# Altium footprint library TimeCard-NIC-V1.PcbLib: 104 footprints (part 4 of 7)
Each footprint in its own frame and in the unit in brackets; x right, y up, seen from the top. Pads: shape width x height; smd on the part's side, far side on the other; paste and mask are expansions set on the pad; w line width, h text height; cw(c..) or ccw(c..) is an arc to the next point about the centre after c.
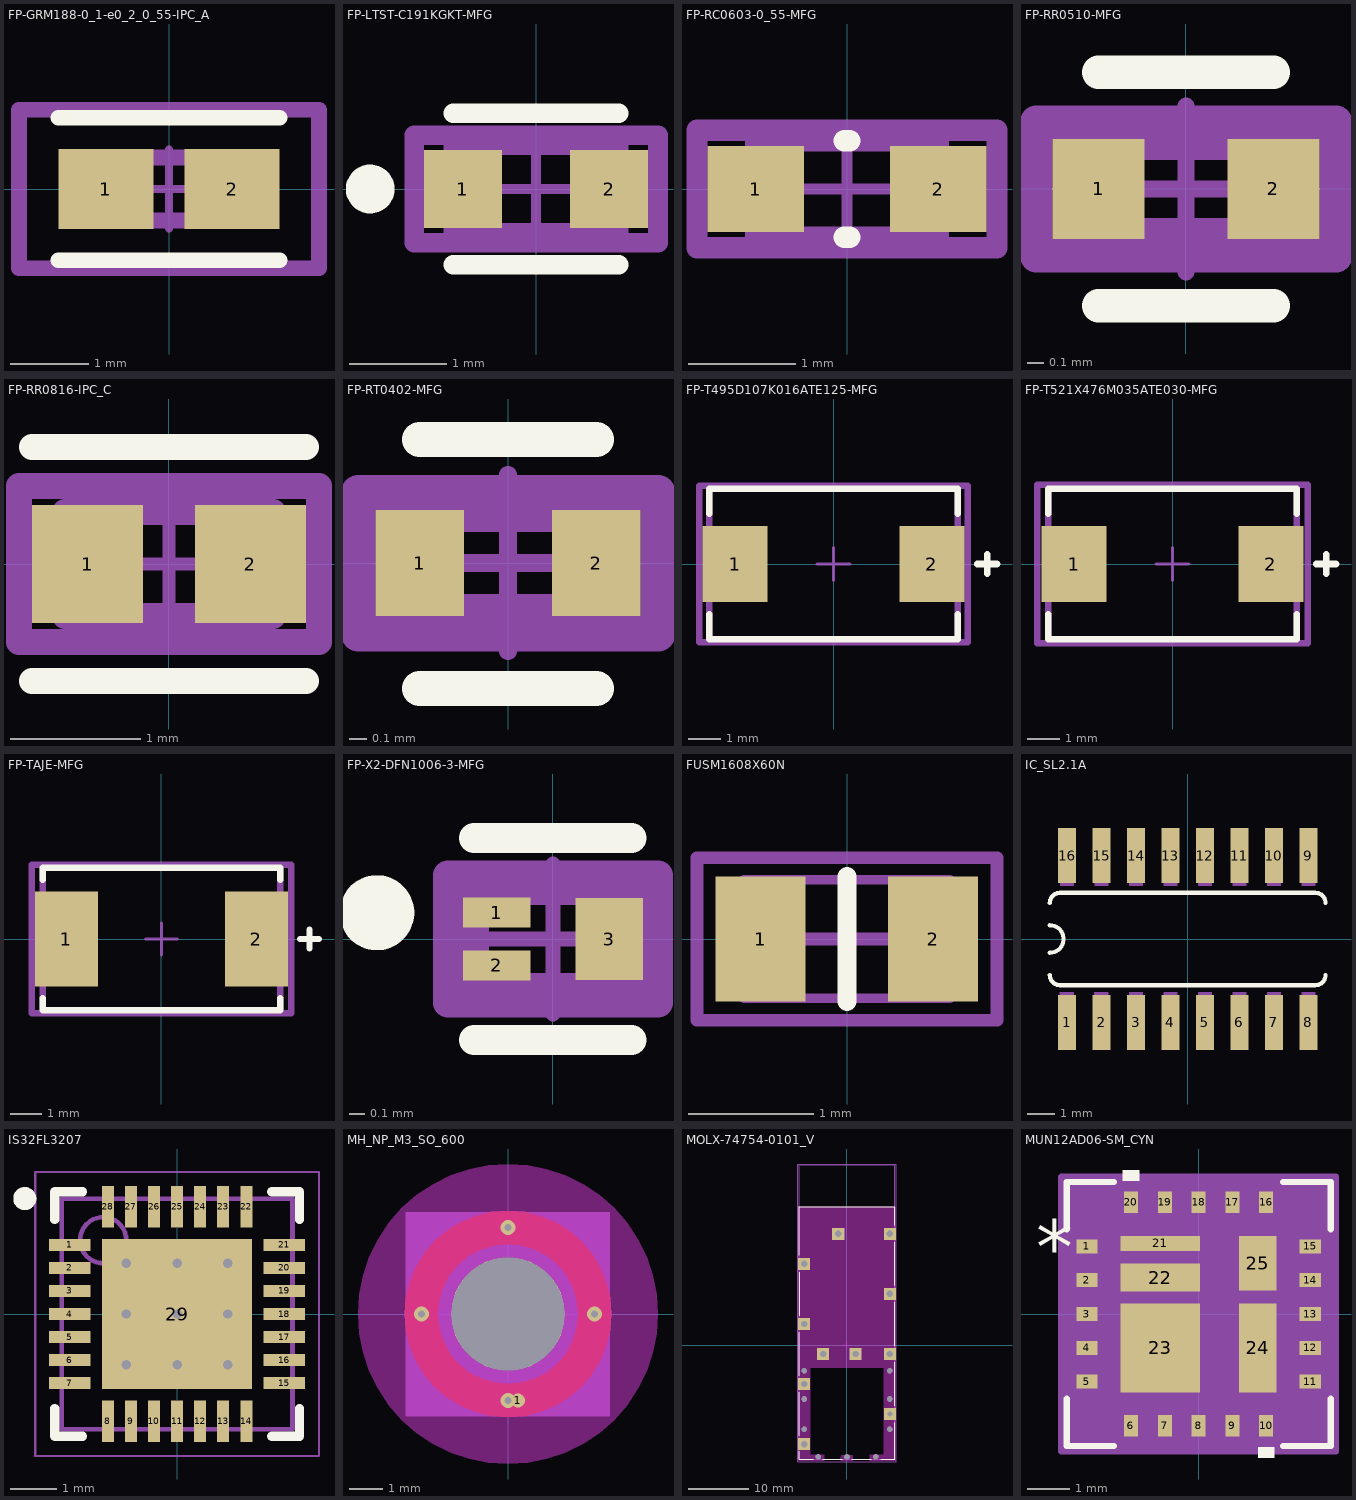
[diagram p3: the footprints below, top view; thin cyan lines are the x and y axes]

## FP-GRM188-0_1-e0_2_0_55-IPC_A [mm]
pads (2):
  rect 1.208x1.012 smd paste+0 mask+0: 1(-0.802,0) 2(0.802,0)
Top Overlay:
  lines w0.2: -1.406,-0.906 1.406,-0.906 ; -1.406,0.906 1.406,0.906
Top 3D Body:
  lines w0.2: -0.8,-0.4 0.8,-0.4 0.8,0.4 -0.8,0.4 -0.8,-0.4
Top Courtyard:
  lines w0.2: -1.906,-1.006 1.906,-1.006 1.906,1.006 -1.906,1.006 -1.906,-1.006
Top Assembly:
  lines w0.2: -1.906,-1.006 1.906,-1.006 1.906,1.006 -1.906,1.006 -1.906,-1.006
  text ".Designator" at 0,0.188 h1
Top Component Center:
  lines w0.1: -0.5,0 0.5,0 ; 0,-0.5 0,0.5
3D body "Cap_Murata_GRM188R60J106KE47D_eec.STEP": height 0.25, standoff 0, extent -1.906,-1.006 1.906,1.006

## FP-LTST-C191KGKT-MFG [mm]
height 2.65
pads (2):
  rect 0.8x0.8 smd paste+0 mask+0: 1(-0.75,0) 2(0.75,0)
Top Overlay:
  circle w0.25: c-1.7,0 r0.125
  lines w0.2: -0.85,-0.775 0.85,-0.775 ; -0.85,0.775 0.85,0.775
Top 3D Body:
  lines w0.2: -0.85,-0.45 0.85,-0.45 0.85,0.45 -0.85,0.45 -0.85,-0.45
Top Courtyard:
  lines w0.2: -1.25,-0.55 1.25,-0.55 1.25,0.55 -1.25,0.55 -1.25,-0.55
Top Assembly:
  lines w0.2: -1.25,-0.55 1.25,-0.55 1.25,0.55 -1.25,0.55 -1.25,-0.55
  text ".Designator" at 0,-0.001 h1
Top Component Center:
  lines w0.1: -0.5,0 0.5,0 ; 0,-0.5 0,0.5
3D body "Diode_Lite-On_LTST-C191KGKT_eec.STEP": height 0.25, standoff 0, extent -1.25,-0.55 1.25,0.55

## FP-RC0603-0_55-MFG [mm]
height 1.7
pads (2):
  rect 0.9x0.8 smd paste+0 mask+0: 1(-0.85,0) 2(0.85,0)
Top Overlay:
  lines w0.2: -0.025,-0.45 0.025,-0.45 ; -0.025,0.45 0.025,0.45
Top 3D Body:
  lines w0.2: -0.85,-0.45 0.85,-0.45 0.85,0.45 -0.85,0.45 -0.85,-0.45
Top Courtyard:
  lines w0.2: -1.4,-0.55 1.4,-0.55 1.4,0.55 -1.4,0.55 -1.4,-0.55
Top Assembly:
  lines w0.2: -1.4,-0.55 1.4,-0.55 1.4,0.55 -1.4,0.55 -1.4,-0.55
Top Component Center:
  lines w0.1: -0.5,0 0.5,0 ; 0,-0.5 0,0.5
3D body "Res_Yageo_RC0603FR-07100KL_eec.STEP": height 0.25, standoff 0, extent -1.4,-0.55 1.4,0.55

## FP-RR0510-MFG [mm]
pads (2):
  rect 0.55x0.6 smd paste+0 mask+0: 1(-0.525,0) 2(0.525,0)
Top Overlay:
  lines w0.2: -0.525,-0.7 0.525,-0.7 ; -0.525,0.7 0.525,0.7
Top 3D Body:
  lines w0.2: -0.525,-0.275 0.525,-0.275 0.525,0.275 -0.525,0.275 -0.525,-0.275
Top Courtyard:
  lines w0.2: -0.9,-0.4 0.9,-0.4 0.9,0.4 -0.9,0.4 -0.9,-0.4
Top Assembly:
  lines w0.2: -0.9,-0.4 0.9,-0.4 0.9,0.4 -0.9,0.4 -0.9,-0.4
  text ".Designator" at 0,0.188 h1
Top Component Center:
  lines w0.1: -0.5,0 0.5,0 ; 0,-0.5 0,0.5
3D body "Res_Susumu_RR0510R-110-D_eec.STEP": height 0.25, standoff 0, extent -0.9,-0.4 0.9,0.4

## FP-RR0816-IPC_C [mm]
height 10.85
pads (2):
  rect 0.855x0.906 smd paste+0 mask+0: 1(-0.626,0) 2(0.626,0)
Top Overlay:
  lines w0.2: -1.053,-0.9 1.053,-0.9 ; -1.053,0.9 1.053,0.9
Top 3D Body:
  lines w0.2: -0.8,-0.4 0.8,-0.4 0.8,0.4 -0.8,0.4 -0.8,-0.4
Top Courtyard:
  lines w0.2: -1.153,-0.6 1.153,-0.6 1.153,0.6 -1.153,0.6 -1.153,-0.6
Top Assembly:
  lines w0.2: -1.153,-0.6 1.153,-0.6 1.153,0.6 -1.153,0.6 -1.153,-0.6
  text ".Designator" at 0,0.188 h1
Top Component Center:
  lines w0.1: -0.5,0 0.5,0 ; 0,-0.5 0,0.5
3D body "Res_Susumu_RR0816P-364-D_eec.STEP": height 0.25, standoff 0, extent -1.153,-0.6 1.153,0.6

## FP-RT0402-MFG [mm]
height 10.85
pads (2):
  rect 0.5x0.6 smd paste+0 mask+0: 1(-0.5,0) 2(0.5,0)
Top Overlay:
  lines w0.2: -0.5,-0.711 0.5,-0.711 ; -0.5,0.7 0.5,0.7
Top 3D Body:
  lines w0.2: -0.55,-0.275 0.55,-0.275 0.55,0.275 -0.55,0.275 -0.55,-0.275
Top Courtyard:
  lines w0.2: -0.85,-0.4 0.85,-0.4 0.85,0.4 -0.85,0.4 -0.85,-0.4
Top Assembly:
  lines w0.2: -0.85,-0.4 0.85,-0.4 0.85,0.4 -0.85,0.4 -0.85,-0.4
  text ".Designator" at 0,0.188 h1
Top Component Center:
  lines w0.1: -0.5,0 0.5,0 ; 0,-0.5 0,0.5
3D body "Res_Yageo_RT0402BRE07118KL_eec.STEP": height 0.25, standoff 0, extent -0.85,-0.4 0.85,0.4

## FP-T495D107K016ATE125-MFG [mm]
height 10.85
pads (2):
  rect 1.99x2.33 smd paste+0 mask+0: 1(-3.01,0) 2(3.01,0)
Top Overlay:
  lines w0.2: -3.8,-1.54 -3.8,-2.3 3.8,-2.3 3.8,-1.54 ; -3.8,1.54 -3.8,2.3 3.8,2.3 3.8,1.54 ; 4.4,0 5,0 ; 4.7,-0.3 4.7,0.3
Top 3D Body:
  lines w0.2: -3.8,-2.3 3.8,-2.3 3.8,2.3 -3.8,2.3 -3.8,-2.3
Top Courtyard:
  lines w0.2: -4.105,-2.4 4.105,-2.4 4.105,2.4 -4.105,2.4 -4.105,-2.4
Top Assembly:
  lines w0.2: -4.105,-2.4 4.105,-2.4 4.105,2.4 -4.105,2.4 -4.105,-2.4
  text ".Designator" at 0,-0.001 h1
Top Component Center:
  lines w0.1: -0.5,0 0.5,0 ; 0,-0.5 0,0.5
3D body "Cap_Kemet_T495D107K016ATE125_eec.STEP": height 0.25, standoff 0, extent -4.105,-2.4 4.105,2.4

## FP-T521X476M035ATE030-MFG [mm]
height 10.85
pads (2):
  rect 1.99x2.33 smd paste+0 mask+0: 1(-3.01,0) 2(3.01,0)
Top Overlay:
  lines w0.2: -3.8,-1.54 -3.8,-2.3 3.8,-2.3 3.8,-1.54 ; -3.8,1.54 -3.8,2.3 3.8,2.3 3.8,1.54 ; 4.4,0 5,0 ; 4.7,-0.3 4.7,0.3
Top 3D Body:
  lines w0.2: -3.8,-2.3 3.8,-2.3 3.8,2.3 -3.8,2.3 -3.8,-2.3
Top Courtyard:
  lines w0.2: -4.13,-2.42 4.13,-2.42 4.13,2.42 -4.13,2.42 -4.13,-2.42
Top Assembly:
  lines w0.2: -4.13,-2.42 4.13,-2.42 4.13,2.42 -4.13,2.42 -4.13,-2.42
  text ".Designator" at 0,-0.001 h1
Top Component Center:
  lines w0.1: -0.5,0 0.5,0 ; 0,-0.5 0,0.5
3D body "Cap_Kemet_T521X476M035ATE030_eec.STEP": height 0.25, standoff 0, extent -4.13,-2.42 4.13,2.42

## FP-TAJE-MFG [mm]
height 10.85
pads (2):
  rect 2x3 smd paste+0 mask+0: 1(-3,0) 2(3,0)
Top Overlay:
  lines w0.2: -3.75,-1.875 -3.75,-2.25 3.75,-2.25 3.75,-1.875 ; -3.75,1.875 -3.75,2.25 3.75,2.25 3.75,1.875 ; 4.375,0 4.975,0 ; 4.675,-0.3 4.675,0.3
Top 3D Body:
  lines w0.2: -3.75,-2.25 3.75,-2.25 3.75,2.25 -3.75,2.25 -3.75,-2.25
Top Courtyard:
  lines w0.2: -4.1,-2.35 4.1,-2.35 4.1,2.35 -4.1,2.35 -4.1,-2.35
Top Assembly:
  lines w0.2: -4.1,-2.35 4.1,-2.35 4.1,2.35 -4.1,2.35 -4.1,-2.35
  text ".Designator" at 0,-0.001 h1
Top Component Center:
  lines w0.1: -0.5,0 0.5,0 ; 0,-0.5 0,0.5
3D body "Cap_AVX_TAJE108K002RNJ_eec.STEP": height 0.25, standoff 0, extent -4.1,-2.35 4.1,2.35

## FP-X2-DFN1006-3-MFG [mm]
height 10.85
pads (3):
  rect 0.45x0.2 smd paste+0 mask+0: 1(-0.375,0.175) 2(-0.375,-0.175)
  rect 0.45x0.55 smd paste+0 mask+0: 3(0.375,0)
Top Overlay:
  circle w0.25: c-1.175,0.175 r0.125
  lines w0.2: -0.525,-0.675 0.525,-0.675 ; -0.525,0.675 0.525,0.675
Top 3D Body:
  lines w0.2: -0.525,-0.325 0.525,-0.325 0.525,0.325 -0.525,0.325 -0.525,-0.325
Top Courtyard:
  lines w0.2: -0.7,-0.425 0.7,-0.425 0.7,0.425 -0.7,0.425 -0.7,-0.425
Top Assembly:
  lines w0.2: -0.7,-0.425 0.7,-0.425 0.7,0.425 -0.7,0.425 -0.7,-0.425
  text ".Designator" at 0,-0.001 h1
Top Component Center:
  lines w0.1: -0.5,0 0.5,0 ; 0,-0.5 0,0.5
3D body "Trans_Diodes_Inc_DMN26D0UFB4-7_eec.STEP": height 0.25, standoff 0, extent -0.7,-0.425 0.7,0.425

## FUSM1608X60N [mm] "Chip Fuse, 0603, 2-Leads, Body 1.60x0.81mm, IPC Medium Density"
height 0.5
pads (2):
  rect 0.72x1 smd: 1(-0.69,0) 2(0.69,0)
Top Overlay:
  lines w0.152: 0,-0.5 0,0.5
Mechanical 13:
  lines w0.076: -0.825,-0.475 0.825,-0.475 0.825,0.475 -0.825,0.475 -0.825,-0.475
  text ".Designator" at -0.41,-0.327 h1.02
Mechanical 15:
  lines w0.102: -0.475,0 0.475,0 ; 0,-0.475 0,0.475 ; -1.2,-0.65 1.2,-0.65 1.2,0.65 -1.2,0.65 -1.2,-0.65
3D body: height 0.13, standoff 0, extent 0.457,-0.305 0.686,0.305
3D body: height 0.13, standoff 0, extent -0.686,-0.305 -0.457,0.305
3D body: height 0.61, standoff 0.25, extent -0.813,-0.406 0.813,0.406
3D body: height 0.25, standoff 0.05, extent -0.813,-0.406 0.813,0.406

## IC_SL2.1A [mil]
pads (16):
  rect 26x80 smd: 1(-175,-121) 2(-125,-121) 3(-75,-121) 4(-25,-121) 5(25,-121) 6(75,-121) 7(125,-121) 8(175,-121) 9(175,121) 10(125,121) 11(75,121) 12(25,121) 13(-25,121) 14(-75,121) 15(-125,121) 16(-175,121)
Top Overlay:
  lines w6: -200,-52 ccw(c-185,-52) -185,-67 185,-67 ccw(c185,-52) 200,-52 ; -200,-20 ccw(c-200,0) -200,20 ; -200,52 cw(c-185,52) -185,67 185,67 cw(c185,52) 200,52
Mechanical 13:
  region: -15,77 -35,77 -35,122 -15,122
  region: -165,-122.18 -185.27,-122.18 -185.27,-77 -165,-77
  region: -115,-122.16 -135.18,-122.16 -135.18,-77 -115,-77
  region: -65,-122.55 -85.07,-122.55 -85.07,-77.45 -65,-77.45
  region: -15,-122.14 -35.04,-122.14 -35.04,-77 -15,-77
  region: -65,77.09 -85.1,77.09 -85.1,122 -65,122
  region: -115,77.03 -135.05,77.03 -135.05,122 -115,122
  region: -165,77.01 -185.02,77.01 -185.02,122 -165,122
  region: 35,-122.06 15.01,-122.06 15.01,-77 35,-77
  region: 85,-122.16 65.08,-122.16 65.08,-77 85,-77
  region: 135,-122.14 115.13,-122.14 115.13,-77 135,-77
  region: 185,-122.08 165.11,-122.08 165.11,-77 185,-77
  region: 35,77.14 15.03,77.14 15.03,122 35,122
  region: 85,77.12 65.1,77.12 65.1,122 85,122
  region: 135,77.02 115.02,77.02 115.02,122 135,122
  region: 185,77.02 165.05,77.02 165.05,122 185,122
3D body "CircuitWorks-SO-16.step": height 57, standoff 0, extent -196.5,-115 196.5,117.49

## IS32FL3207 [mm]
height 0.8
pads (29):
  rect 0.9x0.26 smd: 1(-2.325,1.5) 2(-2.325,1) 3(-2.325,0.5) 4(-2.325,0) 5(-2.325,-0.5) 6(-2.325,-1) 7(-2.325,-1.5) 15(2.325,-1.5) 16(2.325,-1) 17(2.325,-0.5) 18(2.325,0) 19(2.325,0.5) 20(2.325,1) 21(2.325,1.5)
  rect 0.26x0.9 smd: 8(-1.5,-2.325) 9(-1,-2.325) 10(-0.5,-2.325) 11(0,-2.325) 12(0.5,-2.325) 13(1,-2.325) 14(1.5,-2.325) 22(1.5,2.325) 23(1,2.325) 24(0.5,2.325) 25(0,2.325) 26(-0.5,2.325) 27(-1,2.325) 28(-1.5,2.325)
  rect 3.25x3.25 smd: 29(0,0)
via 1.1,-1.1 diameter 0.406 hole 0.203
via 0,-1.1 diameter 0.406 hole 0.203
via -1.1,-1.1 diameter 0.406 hole 0.203
via 1.1,0 diameter 0.406 hole 0.203
via 0,0 diameter 0.406 hole 0.203
via -1.1,0 diameter 0.406 hole 0.203
via 1.1,1.1 diameter 0.406 hole 0.203
via 0,1.1 diameter 0.406 hole 0.203
via -1.1,1.1 diameter 0.406 hole 0.203
Top Overlay:
  circle w0.25: c-3.3,2.5 r0.125
  lines w0.2: -2.65,-2.05 -2.65,-2.65 -2.05,-2.65 ; -2.65,2.05 -2.65,2.65 -2.05,2.65 ; 2.05,-2.65 2.65,-2.65 2.65,-2.05 ; 2.05,2.65 2.65,2.65 2.65,2.05
Mechanical 13:
  circle w0.1: c-1.6,1.6 r0.5
  lines w0.1: -2.5,-2.5 2.5,-2.5 2.5,2.5 -2.5,2.5 -2.5,-2.5
Mechanical 15:
  lines w0.05: -3.075,-3.075 3.075,-3.075 3.075,3.075 -3.075,3.075 -3.075,-3.075
  lines w0.1: -0.5,0 0.5,0 ; 0,-0.5 0,0.5
3D body "jj.step": height 0.8, standoff 0, extent -2.501,-2.501 2.501,2.501

## MH_NP_M3_SO_600 [mm] "MH_NP_M3_SO_600"
pads (2):
  round 0.43 smd: 1(0.3,-2.6)
  round 3.4 hole 3.404 unplated: ""(0,0)
via 0,-2.6 diameter 0.457 hole 0.203
via 0,2.6 diameter 0.457 hole 0.203
via 2.6,0 diameter 0.457 hole 0.203
via -2.6,0 diameter 0.457 hole 0.203
Top Layer:
  region: 3.111,0 3.073,0.487 2.959,0.961 2.772,1.412 2.517,1.829 2.2,2.2 1.829,2.517 1.412,2.772 0.961,2.959 0.487,3.073 0,3.111 -0.487,3.073 -0.961,2.959 -1.412,2.772 -1.551,2.687 -1.829,2.517 -2.2,2.2 -2.517,1.829 -2.772,1.412 -2.959,0.961 -3.073,0.487 -3.111,0 -3.073,-0.487 -2.959,-0.961 -2.772,-1.412 -2.517,-1.829 -2.2,-2.2 -1.829,-2.517 -1.551,-2.687 -1.412,-2.772 -0.961,-2.959 -0.487,-3.073 0,-3.111 0.487,-3.073 0.961,-2.959 1.412,-2.772 1.829,-2.517 2.2,-2.2 2.517,-1.829 2.772,-1.412 2.959,-0.961 3.073,-0.487 hole: 2.098,0 2.058,0.409 1.938,0.803 1.745,1.166 1.484,1.484 1.166,1.745 0.803,1.938 0.409,2.058 0,2.098 -0.409,2.058 -0.803,1.938 -1.045,1.809 -1.045,1.809 -1.166,1.745 -1.484,1.484 -1.745,1.166 -1.938,0.803 -2.058,0.409 -2.098,0 -2.058,-0.409 -1.938,-0.803 -1.745,-1.166 -1.484,-1.484 -1.166,-1.745 -1.045,-1.809 -1.045,-1.809 -0.803,-1.938 -0.409,-2.058 0,-2.098 0.409,-2.058 0.803,-1.938 1.166,-1.745 1.484,-1.484 1.745,-1.166 1.938,-0.803 2.058,-0.409 2.098,0
Top Layer keep-out:
  region: 4.51,0 4.471,0.589 4.356,1.167 4.166,1.726 3.905,2.255 3.578,2.745 3.189,3.189 2.745,3.578 2.255,3.905 1.726,4.166 1.167,4.356 0.589,4.471 0,4.51 -0.589,4.471 -1.167,4.356 -1.726,4.166 -2.255,3.905 -2.745,3.578 -3.189,3.189 -3.578,2.745 -3.905,2.255 -4.166,1.726 -4.356,1.167 -4.471,0.589 -4.51,0 -4.471,-0.589 -4.356,-1.167 -4.166,-1.726 -3.905,-2.255 -3.578,-2.745 -3.189,-3.189 -2.745,-3.578 -2.255,-3.905 -1.726,-4.166 -1.167,-4.356 -0.589,-4.471 0,-4.51 0.589,-4.471 1.167,-4.356 1.726,-4.166 2.255,-3.905 2.745,-3.578 3.189,-3.189 3.578,-2.745 3.905,-2.255 4.166,-1.726 4.356,-1.167 4.471,-0.589
  region: 4.51,0 4.471,0.589 4.356,1.167 4.166,1.726 3.905,2.255 3.578,2.745 3.189,3.189 2.745,3.578 2.255,3.905 1.726,4.166 1.167,4.356 0.589,4.471 0,4.51 -0.589,4.471 -1.167,4.356 -1.726,4.166 -2.255,3.905 -2.745,3.578 -3.189,3.189 -3.578,2.745 -3.905,2.255 -4.166,1.726 -4.356,1.167 -4.471,0.589 -4.51,0 -4.471,-0.589 -4.356,-1.167 -4.166,-1.726 -3.905,-2.255 -3.578,-2.745 -3.189,-3.189 -2.745,-3.578 -2.255,-3.905 -1.726,-4.166 -1.167,-4.356 -0.589,-4.471 0,-4.51 0.589,-4.471 1.167,-4.356 1.726,-4.166 2.255,-3.905 2.745,-3.578 3.189,-3.189 3.578,-2.745 3.905,-2.255 4.166,-1.726 4.356,-1.167 4.471,-0.589
Mid-Layer 1 keep-out:
  region: 2.365,0 2.32,0.461 2.185,0.905 1.967,1.314 1.672,1.672 1.314,1.967 0.905,2.185 0.461,2.32 0,2.365 -0.461,2.32 -0.905,2.185 -1.177,2.039 -1.314,1.967 -1.672,1.672 -1.967,1.314 -2.185,0.905 -2.32,0.461 -2.365,0 -2.32,-0.461 -2.185,-0.905 -1.967,-1.314 -1.672,-1.672 -1.314,-1.967 -1.177,-2.039 -0.905,-2.185 -0.461,-2.32 0,-2.365 0.461,-2.32 0.905,-2.185 1.314,-1.967 1.672,-1.672 1.967,-1.314 2.185,-0.905 2.32,-0.461
Mid-Layer 2 keep-out:
  region: 4.51,0 4.471,0.589 4.356,1.167 4.166,1.726 3.905,2.255 3.578,2.745 3.189,3.189 2.745,3.578 2.255,3.905 1.726,4.166 1.167,4.356 0.589,4.471 0,4.51 -0.589,4.471 -1.167,4.356 -1.726,4.166 -2.255,3.905 -2.745,3.578 -3.189,3.189 -3.578,2.745 -3.905,2.255 -4.166,1.726 -4.356,1.167 -4.471,0.589 -4.51,0 -4.471,-0.589 -4.356,-1.167 -4.166,-1.726 -3.905,-2.255 -3.578,-2.745 -3.189,-3.189 -2.745,-3.578 -2.255,-3.905 -1.726,-4.166 -1.167,-4.356 -0.589,-4.471 0,-4.51 0.589,-4.471 1.167,-4.356 1.726,-4.166 2.255,-3.905 2.745,-3.578 3.189,-3.189 3.578,-2.745 3.905,-2.255 4.166,-1.726 4.356,-1.167 4.471,-0.589
Mid-Layer 3 keep-out:
  region: 2.365,0 2.32,0.461 2.185,0.905 1.967,1.314 1.672,1.672 1.314,1.967 0.905,2.185 0.461,2.32 0,2.365 -0.461,2.32 -0.905,2.185 -1.177,2.039 -1.314,1.967 -1.672,1.672 -1.967,1.314 -2.185,0.905 -2.32,0.461 -2.365,0 -2.32,-0.461 -2.185,-0.905 -1.967,-1.314 -1.672,-1.672 -1.314,-1.967 -1.177,-2.039 -0.905,-2.185 -0.461,-2.32 0,-2.365 0.461,-2.32 0.905,-2.185 1.314,-1.967 1.672,-1.672 1.967,-1.314 2.185,-0.905 2.32,-0.461
Mid-Layer 4 keep-out:
  region: 4.51,0 4.471,0.589 4.356,1.167 4.166,1.726 3.905,2.255 3.578,2.745 3.189,3.189 2.745,3.578 2.255,3.905 1.726,4.166 1.167,4.356 0.589,4.471 0,4.51 -0.589,4.471 -1.167,4.356 -1.726,4.166 -2.255,3.905 -2.745,3.578 -3.189,3.189 -3.578,2.745 -3.905,2.255 -4.166,1.726 -4.356,1.167 -4.471,0.589 -4.51,0 -4.471,-0.589 -4.356,-1.167 -4.166,-1.726 -3.905,-2.255 -3.578,-2.745 -3.189,-3.189 -2.745,-3.578 -2.255,-3.905 -1.726,-4.166 -1.167,-4.356 -0.589,-4.471 0,-4.51 0.589,-4.471 1.167,-4.356 1.726,-4.166 2.255,-3.905 2.745,-3.578 3.189,-3.189 3.578,-2.745 3.905,-2.255 4.166,-1.726 4.356,-1.167 4.471,-0.589
Mid-Layer 5 keep-out:
  region: 2.365,0 2.32,0.461 2.185,0.905 1.967,1.314 1.672,1.672 1.314,1.967 0.905,2.185 0.461,2.32 0,2.365 -0.461,2.32 -0.905,2.185 -1.177,2.039 -1.314,1.967 -1.672,1.672 -1.967,1.314 -2.185,0.905 -2.32,0.461 -2.365,0 -2.32,-0.461 -2.185,-0.905 -1.967,-1.314 -1.672,-1.672 -1.314,-1.967 -1.177,-2.039 -0.905,-2.185 -0.461,-2.32 0,-2.365 0.461,-2.32 0.905,-2.185 1.314,-1.967 1.672,-1.672 1.967,-1.314 2.185,-0.905 2.32,-0.461
Mid-Layer 6 keep-out:
  region: 2.365,0 2.32,0.461 2.185,0.905 1.967,1.314 1.672,1.672 1.314,1.967 0.905,2.185 0.461,2.32 0,2.365 -0.461,2.32 -0.905,2.185 -1.177,2.039 -1.314,1.967 -1.672,1.672 -1.967,1.314 -2.185,0.905 -2.32,0.461 -2.365,0 -2.32,-0.461 -2.185,-0.905 -1.967,-1.314 -1.672,-1.672 -1.314,-1.967 -1.177,-2.039 -0.905,-2.185 -0.461,-2.32 0,-2.365 0.461,-2.32 0.905,-2.185 1.314,-1.967 1.672,-1.672 1.967,-1.314 2.185,-0.905 2.32,-0.461
Mid-Layer 7 keep-out:
  region: 2.365,0 2.32,0.461 2.185,0.905 1.967,1.314 1.672,1.672 1.314,1.967 0.905,2.185 0.461,2.32 0,2.365 -0.461,2.32 -0.905,2.185 -1.177,2.039 -1.314,1.967 -1.672,1.672 -1.967,1.314 -2.185,0.905 -2.32,0.461 -2.365,0 -2.32,-0.461 -2.185,-0.905 -1.967,-1.314 -1.672,-1.672 -1.314,-1.967 -1.177,-2.039 -0.905,-2.185 -0.461,-2.32 0,-2.365 0.461,-2.32 0.905,-2.185 1.314,-1.967 1.672,-1.672 1.967,-1.314 2.185,-0.905 2.32,-0.461
Mid-Layer 8 keep-out:
  region: 2.365,0 2.32,0.461 2.185,0.905 1.967,1.314 1.672,1.672 1.314,1.967 0.905,2.185 0.461,2.32 0,2.365 -0.461,2.32 -0.905,2.185 -1.177,2.039 -1.314,1.967 -1.672,1.672 -1.967,1.314 -2.185,0.905 -2.32,0.461 -2.365,0 -2.32,-0.461 -2.185,-0.905 -1.967,-1.314 -1.672,-1.672 -1.314,-1.967 -1.177,-2.039 -0.905,-2.185 -0.461,-2.32 0,-2.365 0.461,-2.32 0.905,-2.185 1.314,-1.967 1.672,-1.672 1.967,-1.314 2.185,-0.905 2.32,-0.461
Mid-Layer 9 keep-out:
  region: 4.51,0 4.471,0.589 4.356,1.167 4.166,1.726 3.905,2.255 3.578,2.745 3.189,3.189 2.745,3.578 2.255,3.905 1.726,4.166 1.167,4.356 0.589,4.471 0,4.51 -0.589,4.471 -1.167,4.356 -1.726,4.166 -2.255,3.905 -2.745,3.578 -3.189,3.189 -3.578,2.745 -3.905,2.255 -4.166,1.726 -4.356,1.167 -4.471,0.589 -4.51,0 -4.471,-0.589 -4.356,-1.167 -4.166,-1.726 -3.905,-2.255 -3.578,-2.745 -3.189,-3.189 -2.745,-3.578 -2.255,-3.905 -1.726,-4.166 -1.167,-4.356 -0.589,-4.471 0,-4.51 0.589,-4.471 1.167,-4.356 1.726,-4.166 2.255,-3.905 2.745,-3.578 3.189,-3.189 3.578,-2.745 3.905,-2.255 4.166,-1.726 4.356,-1.167 4.471,-0.589
Mid-Layer 10 keep-out:
  region: 2.365,0 2.32,0.461 2.185,0.905 1.967,1.314 1.672,1.672 1.314,1.967 0.905,2.185 0.461,2.32 0,2.365 -0.461,2.32 -0.905,2.185 -1.177,2.039 -1.314,1.967 -1.672,1.672 -1.967,1.314 -2.185,0.905 -2.32,0.461 -2.365,0 -2.32,-0.461 -2.185,-0.905 -1.967,-1.314 -1.672,-1.672 -1.314,-1.967 -1.177,-2.039 -0.905,-2.185 -0.461,-2.32 0,-2.365 0.461,-2.32 0.905,-2.185 1.314,-1.967 1.672,-1.672 1.967,-1.314 2.185,-0.905 2.32,-0.461
Mid-Layer 11 keep-out:
  region: 4.51,0 4.471,0.589 4.356,1.167 4.166,1.726 3.905,2.255 3.578,2.745 3.189,3.189 2.745,3.578 2.255,3.905 1.726,4.166 1.167,4.356 0.589,4.471 0,4.51 -0.589,4.471 -1.167,4.356 -1.726,4.166 -2.255,3.905 -2.745,3.578 -3.189,3.189 -3.578,2.745 -3.905,2.255 -4.166,1.726 -4.356,1.167 -4.471,0.589 -4.51,0 -4.471,-0.589 -4.356,-1.167 -4.166,-1.726 -3.905,-2.255 -3.578,-2.745 -3.189,-3.189 -2.745,-3.578 -2.255,-3.905 -1.726,-4.166 -1.167,-4.356 -0.589,-4.471 0,-4.51 0.589,-4.471 1.167,-4.356 1.726,-4.166 2.255,-3.905 2.745,-3.578 3.189,-3.189 3.578,-2.745 3.905,-2.255 4.166,-1.726 4.356,-1.167 4.471,-0.589
Mid-Layer 12 keep-out:
  region: 2.365,0 2.32,0.461 2.185,0.905 1.967,1.314 1.672,1.672 1.314,1.967 0.905,2.185 0.461,2.32 0,2.365 -0.461,2.32 -0.905,2.185 -1.177,2.039 -1.314,1.967 -1.672,1.672 -1.967,1.314 -2.185,0.905 -2.32,0.461 -2.365,0 -2.32,-0.461 -2.185,-0.905 -1.967,-1.314 -1.672,-1.672 -1.314,-1.967 -1.177,-2.039 -0.905,-2.185 -0.461,-2.32 0,-2.365 0.461,-2.32 0.905,-2.185 1.314,-1.967 1.672,-1.672 1.967,-1.314 2.185,-0.905 2.32,-0.461
Bottom Layer:
  region: 3.11,0 3.071,0.486 2.957,0.961 2.771,1.412 2.516,1.828 2.199,2.199 1.828,2.516 1.412,2.771 0.961,2.957 0.486,3.071 0,3.11 -0.486,3.071 -0.961,2.957 -1.412,2.771 -1.551,2.686 -1.828,2.516 -2.199,2.199 -2.516,1.828 -2.771,1.412 -2.957,0.961 -3.071,0.486 -3.11,0 -3.071,-0.486 -2.957,-0.961 -2.771,-1.412 -2.516,-1.828 -2.199,-2.199 -1.828,-2.516 -1.551,-2.686 -1.412,-2.771 -0.961,-2.957 -0.486,-3.071 0,-3.11 0.486,-3.071 0.961,-2.957 1.412,-2.771 1.828,-2.516 2.199,-2.199 2.516,-1.828 2.771,-1.412 2.957,-0.961 3.071,-0.486 hole: 2.11,0 2.07,0.412 1.95,0.808 1.755,1.172 1.492,1.492 1.172,1.755 0.808,1.95 0.412,2.07 0,2.11 -0.412,2.07 -0.808,1.95 -1.051,1.82 -1.051,1.82 -1.172,1.755 -1.492,1.492 -1.755,1.172 -1.95,0.808 -2.07,0.412 -2.11,0 -2.07,-0.412 -1.95,-0.808 -1.755,-1.172 -1.492,-1.492 -1.172,-1.755 -1.051,-1.82 -1.051,-1.82 -0.808,-1.95 -0.412,-2.07 0,-2.11 0.412,-2.07 0.808,-1.95 1.172,-1.755 1.492,-1.492 1.755,-1.172 1.95,-0.808 2.07,-0.412 2.11,0
Top Solder:
  dashed: 3.11,0 3.071,0.486 2.957,0.961 2.771,1.412 2.516,1.828 2.199,2.199 1.828,2.516 1.412,2.771 0.961,2.957 0.486,3.071 0,3.11 -0.486,3.071 -0.961,2.957 -1.412,2.771 -1.551,2.686 -1.828,2.516 -2.199,2.199 -2.516,1.828 -2.771,1.412 -2.957,0.961 -3.071,0.486 -3.11,0 -3.071,-0.486 -2.957,-0.961 -2.771,-1.412 -2.516,-1.828 -2.199,-2.199 -1.828,-2.516 -1.551,-2.686 -1.412,-2.771 -0.961,-2.957 -0.486,-3.071 0,-3.11 0.486,-3.071 0.961,-2.957 1.412,-2.771 1.828,-2.516 2.199,-2.199 2.516,-1.828 2.771,-1.412 2.957,-0.961 3.071,-0.486 hole: 2.11,0 2.07,0.412 1.95,0.808 1.755,1.172 1.492,1.492 1.172,1.755 0.808,1.95 0.412,2.07 0,2.11 -0.412,2.07 -0.808,1.95 -1.051,1.82 -1.051,1.82 -1.172,1.755 -1.492,1.492 -1.755,1.172 -1.95,0.808 -2.07,0.412 -2.11,0 -2.07,-0.412 -1.95,-0.808 -1.755,-1.172 -1.492,-1.492 -1.172,-1.755 -1.051,-1.82 -1.051,-1.82 -0.808,-1.95 -0.412,-2.07 0,-2.11 0.412,-2.07 0.808,-1.95 1.172,-1.755 1.492,-1.492 1.755,-1.172 1.95,-0.808 2.07,-0.412 2.11,0
Bottom Solder:
  dashed: 3.11,0 3.071,0.486 2.957,0.961 2.771,1.412 2.516,1.828 2.199,2.199 1.828,2.516 1.412,2.771 0.961,2.957 0.486,3.071 0,3.11 -0.486,3.071 -0.961,2.957 -1.412,2.771 -1.551,2.686 -1.828,2.516 -2.199,2.199 -2.516,1.828 -2.771,1.412 -2.957,0.961 -3.071,0.486 -3.11,0 -3.071,-0.486 -2.957,-0.961 -2.771,-1.412 -2.516,-1.828 -2.199,-2.199 -1.828,-2.516 -1.551,-2.686 -1.412,-2.771 -0.961,-2.957 -0.486,-3.071 0,-3.11 0.486,-3.071 0.961,-2.957 1.412,-2.771 1.828,-2.516 2.199,-2.199 2.516,-1.828 2.771,-1.412 2.957,-0.961 3.071,-0.486 hole: 2.11,0 2.07,0.412 1.95,0.808 1.755,1.172 1.492,1.492 1.172,1.755 0.808,1.95 0.412,2.07 0,2.11 -0.412,2.07 -0.808,1.95 -1.051,1.82 -1.051,1.82 -1.172,1.755 -1.492,1.492 -1.755,1.172 -1.95,0.808 -2.07,0.412 -2.11,0 -2.07,-0.412 -1.95,-0.808 -1.755,-1.172 -1.492,-1.492 -1.172,-1.755 -1.051,-1.82 -1.051,-1.82 -0.808,-1.95 -0.412,-2.07 0,-2.11 0.412,-2.07 0.808,-1.95 1.172,-1.755 1.492,-1.492 1.755,-1.172 1.95,-0.808 2.07,-0.412 2.11,0
Top 3D Body:
  region: -3.065,-3.065 3.065,-3.065 3.065,3.065 -3.065,3.065
Top Courtyard:
  lines w0.025: -3.065,-3.065 3.065,-3.065 3.065,3.065 -3.065,3.065 -3.065,-3.065
Top Assembly:
  lines w0.025: -3.065,-3.065 3.065,-3.065 3.065,3.065 -3.065,3.065 -3.065,-3.065
Bottom Component Center:
  text "1" at -0.608,-2.8 h0.64
Top Component Outline:
  text "MOUNTING HOLE FOR SCREW: 92000A116" at -5.08,20.32 h1.27
  text "WITH STAND OFF: 94868A007, BOTTOM SIDE" at -5.08,16.18 h1.27
  text "CREATED: C. HENLEY 7-30-20" at -5.08,12.7 h1.27
  text "CHECKED:" at -5.08,10.16 h1.27
3D body: height 3.81, standoff 0, extent -3.065,-3.065 3.065,3.065

## MOLX-74754-0101_V [mm] "SFP+ Cage, 1-Port, Body 49x15.9mm"
height 10.85
pads (20):
  rect 2x2 hole 1.05: MH1(-7.125,13.55) MH2(-7.125,3.55) MH3(-7.125,-6.45) MH4(-7.125,-16.45) MH6(7.125,-1.45) MH7(7.125,8.55) MH8(7.125,18.55) MH9(-1.455,18.55) MH10(-3.955,-1.45) MH11(1.445,-1.45)
  rect 2x2 hole 0.85: MH5(7.125,-11.45)
  round 0 hole 0.95: MH12(-7.13,-4.25) MH13(-7.13,-8.95) MH14(-7.13,-13.95) MH15(-4.8,-18.55) MH16(0,-18.55) MH17(4.8,-18.55) MH18(7.13,-13.95) MH19(7.13,-8.95) MH20(7.13,-4.25)
Top Layer keep-out:
  region: 1,-19.25 1,-18.25 -1,-18.25 -1,-19.25
  region: -8.125,23.05 -8.125,-19.25 -3.795,-19.25 -3.795,-18.25 -6.125,-18.25 -6.125,-3.75 6.125,-3.75 6.125,-18.25 3.795,-18.25 3.795,-19.25 8.125,-19.25 8.125,23.05
Top Overlay:
  lines w0.2: -7.952,12.15 -7.95,4.95 ; -7.95,-17.621 -7.95,-18.945 -5.581,-18.945 ; -7.95,-15.05 -7.95,-7.85 ; -7.95,-5.05 -7.95,2.15 ; -7.95,14.95 -7.95,23.055 7.95,23.055 7.95,19.95 ; -4.019,-18.945 -0.781,-18.945 ; 0.781,-18.945 4.019,-18.945 ; 5.581,-18.945 7.95,-18.945 7.95,-12.85 ; 7.95,-10.05 7.95,-2.85 ; 7.95,-0.05 7.95,7.15 ; 7.95,9.95 7.95,17.15
Mechanical 1:
  region: -1,-19.195 -1,-18.55 -1,-18.55 -1,-19.195
Mechanical 13:
  lines w0.1: 7.944,30.055 -7.95,30.055 -7.95,-18.945 7.95,-18.945 7.95,30.055
Mechanical 15:
  lines w0.05: -8.225,-19.35 -8.225,30.155 8.225,30.155 8.225,-19.35 -8.225,-19.35
  lines w0.1: -0.5,0 0.5,0 ; 0,-0.5 0,0.5
3D body "747540101.stp": height 10.21, standoff -3.04, extent -7.949,-18.945 7.949,30.05

## MUN12AD06-SM_CYN [mil]
height 427.17
pads (25):
  rect 20x13 smd paste+0 mask+0: 1(-104,62.99) 2(-104,31.5) 3(-104,0) 4(-104,-31.5) 5(-104,-62.99) 11(104,-62.99) 12(104,-31.5) 13(104,0) 14(104,31.5) 15(104,62.99)
  rect 13x20 smd paste+0 mask+0: 6(-62.99,-104) 7(-31.5,-104) 8(0,-104) 9(31.5,-104) 10(62.99,-104) 16(62.99,104) 17(31.5,104) 18(0,104) 19(-31.5,104) 20(-62.99,104)
  rect 74x14 smd paste+0 mask+0: 21(-35.83,65.75)
  rect 74x26 smd paste+0 mask+0: 22(-35.83,33.86)
  rect 74x83 smd paste+0 mask+0: 23(-35.83,-31.5)
  rect 35x83 smd paste+0 mask+0: 24(55.12,-31.5)
  rect 35x51 smd paste+0 mask+0: 25(55.12,47.24)
Top Overlay:
  region: 70.49,-124 55.49,-124 55.49,-134 70.49,-134
  region: -55.49,124 -70.49,124 -70.49,134 -55.49,134
  lines w6: -123,-79.01 -123,-123 -79.01,-123 ; -123,79.01 -123,123 -79.01,123 ; 79.01,-123 123,-123 123,-79.01 ; 79.01,123 123,123 123,79.01
  text "*" at -151.5,37.99 h50
Mechanical 13:
  lines w1: -118,68 -68,118 ; -118,-118 118,-118 118,118 -118,118 -118,-118 ; -118,-69.49 -118,-56.49 -114,-56.49 -114,-69.49 -118,-69.49 ; -118,-38 -118,-25 -114,-25 -114,-38 -118,-38 ; -118,-6.5 -118,6.5 -114,6.5 -114,-6.5 -118,-6.5 ; -118,25 -118,38 -114,38 -114,25 -118,25 ; -118,56.49 -118,69.49 -114,69.49 -114,56.49 -118,56.49 ; -69.49,-118 -56.49,-118 -56.49,-114 -69.49,-114 -69.49,-118 ; -69.49,114 -56.49,114 -56.49,118 -69.49,118 -69.49,114 ; -38,-118 -25,-118 -25,-114 -38,-114 -38,-118 ; -38,114 -25,114 -25,118 -38,118 -38,114 ; -6.5,-118 6.5,-118 6.5,-114 -6.5,-114 -6.5,-118 ; -6.5,114 6.5,114 6.5,118 -6.5,118 -6.5,114 ; 25,-118 38,-118 38,-114 25,-114 25,-118 ; 25,114 38,114 38,118 25,118 25,114 ; 56.49,-118 69.49,-118 69.49,-114 56.49,-114 56.49,-118 ; 56.49,114 69.49,114 69.49,118 56.49,118 56.49,114 ; 114,-69.49 118,-69.49 118,-56.49 114,-56.49 114,-69.49 ; 114,-38 118,-38 118,-25 114,-25 114,-38 ; 114,-6.5 118,-6.5 118,6.5 114,6.5 114,-6.5 ; 114,25 118,25 118,38 114,38 114,25 ; 114,56.49 118,56.49 118,69.49 114,69.49 114,56.49
  text "*" at -81.5,37.99 h50
Mechanical 15:
  region: -79.49,-128 -128,-128 -128,-79.49 -128,79.49 -128,128 -79.49,128 79.49,128 128,128 128,79.49 128,-79.49 128,-128 79.49,-128
  lines w6: -128,-128 -128,-79.49 -128,79.49 -128,128 -79.49,128 79.49,128 128,128 128,79.49 128,-79.49 128,-128 79.49,-128 -79.49,-128 -128,-128
3D body "MUN12AD06-SM_CYN.step": height 138.11, standoff 0, extent -117.99,-117.99 117.99,117.99